# Altium footprint library Generic Footprint.PcbLib: 160 footprints (part 15 of 20)
Each footprint in its own frame and in the unit in brackets; x right, y up, seen from the top. Pads: shape width x height; smd on the part's side, far side on the other; paste and mask are expansions set on the pad; w line width, h text height; cw(c..) or ccw(c..) is an arc to the next point about the centre after c.
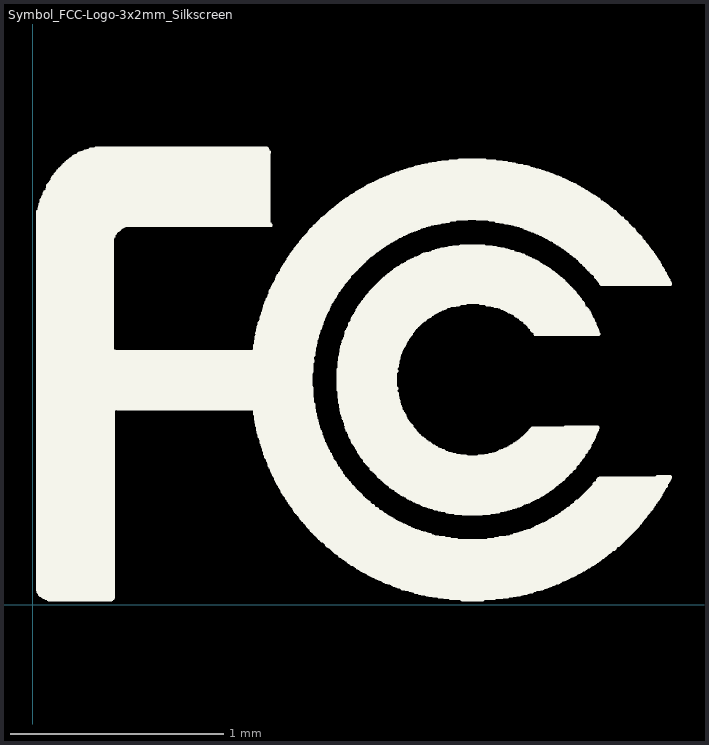
[diagram p14: the footprint, top view; thin cyan lines are the x and y axes]

## Symbol_FCC-Logo-3x2mm_Silkscreen [mm]
pads (8620):
  round 0.02 on Top Overlay: 1(0.025,0.07) 1(0.025,0.073) 1(0.025,0.076) 1(0.025,0.08) 1(0.025,0.083) 1(0.025,0.087) 1(0.025,0.09) 1(0.025,0.093) 1(0.025,0.097) 1(0.025,0.1) 1(0.025,0.104) 1(0.025,0.107) 1(0.025,0.11) 1(0.025,0.114) 1(0.025,0.117) 1(0.025,0.121) 1(0.025,0.124) 1(0.025,0.127) 1(0.025,0.131) 1(0.025,0.134) 1(0.025,0.138) 1(0.025,0.141) 1(0.025,0.144) 1(0.025,0.148) 1(0.025,0.151) 1(0.025,0.155) 1(0.025,0.158) 1(0.025,0.161) 1(0.025,0.165) 1(0.025,0.168) 1(0.025,0.172) 1(0.025,0.175) 1(0.025,0.178) 1(0.025,0.182) 1(0.025,0.185) 1(0.025,0.189) 1(0.025,0.192) 1(0.025,0.195) 1(0.025,0.199) 1(0.025,0.202) 1(0.025,0.206) 1(0.025,0.209) 1(0.025,0.212) 1(0.025,0.216) 1(0.025,0.219) 1(0.025,0.223) 1(0.025,0.226) 1(0.025,0.229) 1(0.025,0.233) 1(0.025,0.236) 1(0.025,0.24) 1(0.025,0.243) 1(0.025,0.246) 1(0.025,0.25) 1(0.025,0.253) 1(0.025,0.257) 1(0.025,0.26) 1(0.025,0.263) 1(0.025,0.267) 1(0.025,0.27) 1(0.025,0.274) 1(0.025,0.277) 1(0.025,0.28) 1(0.025,0.284) 1(0.025,0.287) 1(0.025,0.291) 1(0.025,0.294) 1(0.025,0.297) 1(0.025,0.301) 1(0.025,0.304) 1(0.025,0.308) 1(0.025,0.311) 1(0.025,0.314) 1(0.025,0.318) 1(0.025,0.321) 1(0.025,0.325) 1(0.025,0.328) 1(0.025,0.331) 1(0.025,0.335) 1(0.025,0.338) 1(0.025,0.342) 1(0.025,0.345) 1(0.025,0.348) 1(0.025,0.352) 1(0.025,0.355) 1(0.025,0.359) 1(0.025,0.362) 1(0.025,0.365) 1(0.025,0.369) 1(0.025,0.372) 1(0.025,0.376) 1(0.025,0.379) 1(0.025,0.382) 1(0.025,0.386) 1(0.025,0.389) 1(0.025,0.393) 1(0.025,0.396) 1(0.025,0.399) 1(0.025,0.403) 1(0.025,0.406) 1(0.025,0.41) 1(0.025,0.413) 1(0.025,0.416) 1(0.025,0.42) 1(0.025,0.423) 1(0.025,0.427) 1(0.025,0.43) 1(0.025,0.433) 1(0.025,0.437) 1(0.025,0.44) 1(0.025,0.444) 1(0.025,0.447) 1(0.025,0.45) 1(0.025,0.454) 1(0.025,0.457) 1(0.025,0.461) 1(0.025,0.464) 1(0.025,0.467) 1(0.025,0.471) 1(0.025,0.474) 1(0.025,0.478) 1(0.025,0.481) 1(0.025,0.484) 1(0.025,0.488) 1(0.025,0.491) 1(0.025,0.495) 1(0.025,0.498) 1(0.025,0.501) 1(0.025,0.505) 1(0.025,0.508) 1(0.025,0.512) 1(0.025,0.515) 1(0.025,0.518) 1(0.025,0.522) 1(0.025,0.525) 1(0.025,0.529) 1(0.025,0.532) 1(0.025,0.535) 1(0.025,0.539) 1(0.025,0.542) 1(0.025,0.546) 1(0.025,0.549) 1(0.025,0.552) 1(0.025,0.556) 1(0.025,0.559) 1(0.025,0.563) 1(0.025,0.566) 1(0.025,0.569) 1(0.025,0.573) 1(0.025,0.576) 1(0.025,0.58) 1(0.025,0.583) 1(0.025,0.586) 1(0.025,0.59) 1(0.025,0.593) 1(0.025,0.597) 1(0.025,0.6) 1(0.025,0.603) 1(0.025,0.607) 1(0.025,0.61) 1(0.025,0.614) 1(0.025,0.617) 1(0.025,0.62) 1(0.025,0.624) 1(0.025,0.627) 1(0.025,0.631) 1(0.025,0.634) 1(0.025,0.637) 1(0.025,0.641) 1(0.025,0.644) 1(0.025,0.648) 1(0.025,0.651) 1(0.025,0.654) 1(0.025,0.658) 1(0.025,0.661) 1(0.025,0.665) 1(0.025,0.668) 1(0.025,0.671) 1(0.025,0.675) 1(0.025,0.678) 1(0.025,0.682) 1(0.025,0.685) 1(0.025,0.688) 1(0.025,0.692) 1(0.025,0.695) 1(0.025,0.699) 1(0.025,0.702) 1(0.025,0.705) 1(0.025,0.709) 1(0.025,0.712) 1(0.025,0.716) 1(0.025,0.719) 1(0.025,0.722) 1(0.025,0.726) 1(0.025,0.729) 1(0.025,0.733) 1(0.025,0.736) 1(0.025,0.739) 1(0.025,0.743) 1(0.025,0.746) 1(0.025,0.75) 1(0.025,0.753) 1(0.025,0.756) 1(0.025,0.76) 1(0.025,0.763) 1(0.025,0.767) 1(0.025,0.77) 1(0.025,0.773) 1(0.025,0.777) 1(0.025,0.78) 1(0.025,0.784) 1(0.025,0.787) 1(0.025,0.79) 1(0.025,0.794) 1(0.025,0.797) 1(0.025,0.801) 1(0.025,0.804) 1(0.025,0.807) 1(0.025,0.811) 1(0.025,0.814) 1(0.025,0.818) 1(0.025,0.821) 1(0.025,0.824) 1(0.025,0.828) 1(0.025,0.831) 1(0.025,0.835) 1(0.025,0.838) 1(0.025,0.841) 1(0.025,0.845) 1(0.025,0.848) 1(0.025,0.852) 1(0.025,0.855) 1(0.025,0.858) 1(0.025,0.862) 1(0.025,0.865) 1(0.025,0.869) 1(0.025,0.872) 1(0.025,0.875) 1(0.025,0.879) 1(0.025,0.882) 1(0.025,0.886) 1(0.025,0.889) 1(0.025,0.892) 1(0.025,0.896) 1(0.025,0.899) 1(0.025,0.903) 1(0.025,0.906) 1(0.025,0.909) 1(0.025,0.913) 1(0.025,0.916) 1(0.025,0.92) 1(0.025,0.923) 1(0.025,0.926) 1(0.025,0.93) 1(0.025,0.933) 1(0.025,0.937) 1(0.025,0.94) 1(0.025,0.943) 1(0.025,0.947) 1(0.025,0.95) 1(0.025,0.954) 1(0.025,0.957) 1(0.025,0.96) 1(0.025,0.964) 1(0.025,0.967) 1(0.025,0.971) 1(0.025,0.974) 1(0.025,0.977) 1(0.025,0.981) 1(0.025,0.984) 1(0.025,0.988) 1(0.025,0.991) 1(0.025,0.994) 1(0.025,0.998) 1(0.025,1.001) 1(0.025,1.005) 1(0.025,1.008) 1(0.025,1.011) 1(0.025,1.015) 1(0.025,1.018) 1(0.025,1.022) 1(0.025,1.025) 1(0.025,1.028) 1(0.025,1.032) 1(0.025,1.035) 1(0.025,1.039) 1(0.025,1.042) 1(0.025,1.045) 1(0.025,1.049) 1(0.025,1.052) 1(0.025,1.056) 1(0.025,1.059) 1(0.025,1.062) 1(0.025,1.066) 1(0.025,1.069) 1(0.025,1.073) 1(0.025,1.076) 1(0.025,1.079) 1(0.025,1.083) 1(0.025,1.086) 1(0.025,1.09) 1(0.025,1.093) 1(0.025,1.096) 1(0.025,1.1) 1(0.025,1.103) 1(0.025,1.107) 1(0.025,1.11) 1(0.025,1.113) 1(0.025,1.117) 1(0.025,1.12) 1(0.025,1.124) 1(0.025,1.127) 1(0.025,1.13) 1(0.025,1.134) 1(0.025,1.137) 1(0.025,1.141) 1(0.025,1.144) 1(0.025,1.147) 1(0.025,1.151) 1(0.025,1.154) 1(0.025,1.158) 1(0.025,1.161) 1(0.025,1.164) 1(0.025,1.168) 1(0.025,1.171) 1(0.025,1.175) 1(0.025,1.178) 1(0.025,1.181) 1(0.025,1.185) 1(0.025,1.188) 1(0.025,1.192) 1(0.025,1.195) 1(0.025,1.198) 1(0.025,1.202) 1(0.025,1.205) 1(0.025,1.209) 1(0.025,1.212) 1(0.025,1.215) 1(0.025,1.219) 1(0.025,1.222) 1(0.025,1.226) 1(0.025,1.229) 1(0.025,1.232) 1(0.025,1.236) 1(0.025,1.239) 1(0.025,1.243) 1(0.025,1.246) 1(0.025,1.249) 1(0.025,1.253) 1(0.025,1.256) 1(0.025,1.26) 1(0.025,1.263) 1(0.025,1.266) 1(0.025,1.27) 1(0.025,1.273) 1(0.025,1.277) 1(0.025,1.28) 1(0.025,1.283) 1(0.025,1.287) 1(0.025,1.29) 1(0.025,1.294) 1(0.025,1.297) 1(0.025,1.3) 1(0.025,1.304) 1(0.025,1.307) 1(0.025,1.311) 1(0.025,1.314) 1(0.025,1.317) 1(0.025,1.321) 1(0.025,1.324) 1(0.025,1.328) 1(0.025,1.331) 1(0.025,1.334) 1(0.025,1.338) 1(0.025,1.341) 1(0.025,1.345) 1(0.025,1.348) 1(0.025,1.351) 1(0.025,1.355) 1(0.025,1.358) 1(0.025,1.362) 1(0.025,1.365) 1(0.025,1.368) 1(0.025,1.372) 1(0.025,1.375) 1(0.025,1.379) 1(0.025,1.382) 1(0.025,1.385) 1(0.025,1.389) 1(0.025,1.392) 1(0.025,1.396) 1(0.025,1.399) 1(0.025,1.402) 1(0.025,1.406) 1(0.025,1.409) 1(0.025,1.413) 1(0.025,1.416) 1(0.025,1.419) 1(0.025,1.423) 1(0.025,1.426) 1(0.025,1.43) 1(0.025,1.433) 1(0.025,1.436) 1(0.025,1.44) 1(0.025,1.443) 1(0.025,1.447) 1(0.025,1.45) 1(0.025,1.453) 1(0.025,1.457) 1(0.025,1.46) 1(0.025,1.464) 1(0.025,1.467) 1(0.025,1.47) 1(0.025,1.474) 1(0.025,1.477) 1(0.025,1.481) 1(0.025,1.484) 1(0.025,1.487) 1(0.025,1.491) 1(0.025,1.494) 1(0.025,1.498) 1(0.025,1.501) 1(0.025,1.504) 1(0.025,1.508) 1(0.025,1.511) 1(0.025,1.515) 1(0.025,1.518) 1(0.025,1.521) 1(0.025,1.525) 1(0.025,1.528) 1(0.025,1.532) 1(0.025,1.535) 1(0.025,1.538) 1(0.025,1.542) 1(0.025,1.545) 1(0.025,1.549) 1(0.025,1.552) 1(0.025,1.555) 1(0.025,1.559) 1(0.025,1.562) 1(0.025,1.566) 1(0.025,1.569) 1(0.025,1.572) 1(0.025,1.576) 1(0.025,1.579) 1(0.025,1.583) 1(0.025,1.586) 1(0.025,1.589) 1(0.025,1.593) 1(0.025,1.596) 1(0.025,1.6) 1(0.025,1.603) 1(0.025,1.606) 1(0.025,1.61) 1(0.025,1.613) 1(0.025,1.617) 1(0.025,1.62) 1(0.025,1.623) 1(0.025,1.627) 1(0.025,1.63) 1(0.025,1.634) 1(0.025,1.637) 1(0.025,1.64) 1(0.025,1.644) 1(0.025,1.647) 1(0.025,1.651) 1(0.025,1.654) 1(0.025,1.657) 1(0.025,1.661) 1(0.025,1.664) 1(0.025,1.668) 1(0.025,1.671) 1(0.025,1.674) 1(0.025,1.678) 1(0.025,1.681) 1(0.025,1.685) 1(0.025,1.688) 1(0.025,1.691) 1(0.025,1.695) 1(0.025,1.698) 1(0.025,1.702) 1(0.025,1.705) 1(0.025,1.708) 1(0.025,1.712) 1(0.025,1.715) 1(0.025,1.719) 1(0.025,1.722) 1(0.025,1.725) 1(0.025,1.729) 1(0.025,1.732) 1(0.025,1.736) 1(0.025,1.739) 1(0.025,1.742) 1(0.025,1.746) 1(0.025,1.749) 1(0.025,1.753) 1(0.025,1.756) 1(0.025,1.759) 1(0.025,1.763) 1(0.025,1.766) 1(0.025,1.77) 1(0.025,1.773) 1(0.025,1.776) 1(0.025,1.78) 1(0.025,1.783) 1(0.025,1.787) 1(0.025,1.79) 1(0.025,1.793) 1(0.025,1.797) 1(0.025,1.8) 1(0.025,1.804) 1(0.025,1.807) 1(0.025,1.81) 1(0.025,1.814) 1(0.025,1.817) 1(0.025,1.821) 1(0.025,1.824) 1(0.025,1.827) 1(0.025,1.831) 1(0.025,1.834) 1(0.025,1.838) 1(0.029,0.059) 1(0.032,0.063) 1(0.032,0.076) 1(0.032,0.08) 1(0.032,0.083) 1(0.032,0.087) 1(0.032,0.09) 1(0.032,0.093) 1(0.032,0.097) 1(0.032,0.1) 1(0.032,0.104) 1(0.032,0.107) 1(0.032,0.11) 1(0.032,0.114) 1(0.032,0.117) 1(0.032,0.121) 1(0.032,0.124) 1(0.032,0.127) 1(0.032,0.131) 1(0.032,0.134) 1(0.032,0.138) 1(0.032,0.141) 1(0.032,0.144) 1(0.032,0.148) 1(0.032,0.151) 1(0.032,0.155) 1(0.032,0.158) 1(0.032,0.161) 1(0.032,0.165) 1(0.032,0.168) 1(0.032,0.172) 1(0.032,0.175) 1(0.032,0.178) 1(0.032,0.182) 1(0.032,0.185) 1(0.032,0.189) 1(0.032,0.192) 1(0.032,0.195) 1(0.032,0.199) 1(0.032,0.202) 1(0.032,0.206) 1(0.032,0.209) 1(0.032,0.212) 1(0.032,0.216) 1(0.032,0.219) 1(0.032,0.223) 1(0.032,0.226) 1(0.032,0.229) 1(0.032,0.233) 1(0.032,0.236) 1(0.032,0.24) 1(0.032,0.243) 1(0.032,0.246) 1(0.032,0.25) 1(0.032,0.253) 1(0.032,0.257) 1(0.032,0.26) 1(0.032,0.263) 1(0.032,0.267) 1(0.032,0.27) 1(0.032,0.274) 1(0.032,0.277) 1(0.032,0.28) 1(0.032,0.284) 1(0.032,0.287) 1(0.032,0.291) 1(0.032,0.294) 1(0.032,0.297) 1(0.032,0.301) 1(0.032,0.304) 1(0.032,0.308) 1(0.032,0.311) 1(0.032,0.314) 1(0.032,0.318) 1(0.032,0.321) 1(0.032,0.325) 1(0.032,0.328) 1(0.032,0.331) 1(0.032,0.335) 1(0.032,0.338) 1(0.032,0.342) 1(0.032,0.345) 1(0.032,0.348) 1(0.032,0.352) 1(0.032,0.355) 1(0.032,0.359) 1(0.032,0.362) 1(0.032,0.365) 1(0.032,0.369) 1(0.032,0.372) 1(0.032,0.376) 1(0.032,0.379) 1(0.032,0.382) 1(0.032,0.386) 1(0.032,0.389) 1(0.032,0.393) 1(0.032,0.396) 1(0.032,0.399) 1(0.032,0.403) 1(0.032,0.406) 1(0.032,0.41) 1(0.032,0.413) 1(0.032,0.416) 1(0.032,0.42) 1(0.032,0.423) 1(0.032,0.427) 1(0.032,0.43) 1(0.032,0.433) 1(0.032,0.437) 1(0.032,0.44) 1(0.032,0.444) 1(0.032,0.447) 1(0.032,0.45) 1(0.032,0.454) 1(0.032,0.457) 1(0.032,0.461) 1(0.032,0.464) 1(0.032,0.467) 1(0.032,0.471) 1(0.032,0.474) 1(0.032,0.478) 1(0.032,0.481) 1(0.032,0.484) 1(0.032,0.488) 1(0.032,0.491) 1(0.032,0.495) 1(0.032,0.498) 1(0.032,0.501) 1(0.032,0.505) 1(0.032,0.508) 1(0.032,0.512) 1(0.032,0.515) 1(0.032,0.518) 1(0.032,0.522) 1(0.032,0.525) 1(0.032,0.529) 1(0.032,0.532) 1(0.032,0.535) 1(0.032,0.539) 1(0.032,0.542) 1(0.032,0.546) 1(0.032,0.549) 1(0.032,0.552) 1(0.032,0.556) 1(0.032,0.559) 1(0.032,0.563) 1(0.032,0.566) 1(0.032,0.569) 1(0.032,0.573) 1(0.032,0.576) 1(0.032,0.58) 1(0.032,0.583) 1(0.032,0.586) 1(0.032,0.59) 1(0.032,0.593) 1(0.032,0.597) 1(0.032,0.6) 1(0.032,0.603) 1(0.032,0.607) 1(0.032,0.61) 1(0.032,0.614) 1(0.032,0.617) 1(0.032,0.62) 1(0.032,0.624) 1(0.032,0.627) 1(0.032,0.631) 1(0.032,0.634) 1(0.032,0.637) 1(0.032,0.641) 1(0.032,0.644) 1(0.032,0.648) 1(0.032,0.651) 1(0.032,0.654) 1(0.032,0.658) 1(0.032,0.661) 1(0.032,0.665) 1(0.032,0.668) 1(0.032,0.671) 1(0.032,0.675) 1(0.032,0.678) 1(0.032,0.682) 1(0.032,0.685) 1(0.032,0.688) 1(0.032,0.692) 1(0.032,0.695) 1(0.032,0.699) 1(0.032,0.702) 1(0.032,0.705) 1(0.032,0.709) 1(0.032,0.712) 1(0.032,0.716) 1(0.032,0.719) 1(0.032,0.722) 1(0.032,0.726) 1(0.032,0.729) 1(0.032,0.733) 1(0.032,0.736) 1(0.032,0.739) 1(0.032,0.743) 1(0.032,0.746) 1(0.032,0.75) 1(0.032,0.753) 1(0.032,0.756) 1(0.032,0.76) 1(0.032,0.763) 1(0.032,0.767) 1(0.032,0.77) 1(0.032,0.773) 1(0.032,0.777) 1(0.032,0.78) 1(0.032,0.784) 1(0.032,0.787) 1(0.032,0.79) 1(0.032,0.794) 1(0.032,0.797) 1(0.032,0.801) 1(0.032,0.804) 1(0.032,0.807) 1(0.032,0.811) 1(0.032,0.814) 1(0.032,0.818) 1(0.032,0.821) 1(0.032,0.824) 1(0.032,0.828) 1(0.032,0.831) 1(0.032,0.835) 1(0.032,0.838) 1(0.032,0.841) 1(0.032,0.845) 1(0.032,0.848) 1(0.032,0.852) 1(0.032,0.855) 1(0.032,0.858) 1(0.032,0.862) 1(0.032,0.865) 1(0.032,0.869) 1(0.032,0.872) 1(0.032,0.875) 1(0.032,0.879) 1(0.032,0.882) 1(0.032,0.886) 1(0.032,0.889) 1(0.032,0.892) 1(0.032,0.896) 1(0.032,0.899) 1(0.032,0.903) 1(0.032,0.906) 1(0.032,0.909) 1(0.032,0.913) 1(0.032,0.916) 1(0.032,0.92) 1(0.032,0.923) 1(0.032,0.926) 1(0.032,0.93) 1(0.032,0.933) 1(0.032,0.937) 1(0.032,0.94) 1(0.032,0.943) 1(0.032,0.947) 1(0.032,0.95) 1(0.032,0.954) 1(0.032,0.957) 1(0.032,0.96) 1(0.032,0.964) 1(0.032,0.967) 1(0.032,0.971) 1(0.032,0.974) 1(0.032,0.977) 1(0.032,0.981) 1(0.032,0.984) 1(0.032,0.988) 1(0.032,0.991) 1(0.032,0.994) 1(0.032,0.998) 1(0.032,1.001) 1(0.032,1.005) 1(0.032,1.008) 1(0.032,1.011) 1(0.032,1.015) 1(0.032,1.018) 1(0.032,1.022) 1(0.032,1.025) 1(0.032,1.028) 1(0.032,1.032) 1(0.032,1.035) 1(0.032,1.039) 1(0.032,1.042) 1(0.032,1.045) 1(0.032,1.049) 1(0.032,1.052) 1(0.032,1.056) 1(0.032,1.059) 1(0.032,1.062) 1(0.032,1.066) 1(0.032,1.069) 1(0.032,1.073) 1(0.032,1.076) 1(0.032,1.079) 1(0.032,1.083) 1(0.032,1.086) 1(0.032,1.09) 1(0.032,1.093) 1(0.032,1.096) 1(0.032,1.1) 1(0.032,1.103) 1(0.032,1.107) 1(0.032,1.11) 1(0.032,1.113) 1(0.032,1.117) 1(0.032,1.12) 1(0.032,1.124) 1(0.032,1.127) 1(0.032,1.13) 1(0.032,1.134) 1(0.032,1.137) 1(0.032,1.141) 1(0.032,1.144) 1(0.032,1.147) 1(0.032,1.151) 1(0.032,1.154) 1(0.032,1.158) 1(0.032,1.161) 1(0.032,1.164) 1(0.032,1.168) 1(0.032,1.171) 1(0.032,1.175) 1(0.032,1.178) 1(0.032,1.181) 1(0.032,1.185) 1(0.032,1.188) 1(0.032,1.192) 1(0.032,1.195) 1(0.032,1.198) 1(0.032,1.202) 1(0.032,1.205) 1(0.032,1.209) 1(0.032,1.212) 1(0.032,1.215) 1(0.032,1.219) 1(0.032,1.222) 1(0.032,1.226) 1(0.032,1.229) 1(0.032,1.232) 1(0.032,1.236) 1(0.032,1.239) 1(0.032,1.243) 1(0.032,1.246) 1(0.032,1.249) 1(0.032,1.253) 1(0.032,1.256) 1(0.032,1.26) 1(0.032,1.263) 1(0.032,1.266) 1(0.032,1.27) 1(0.032,1.273) 1(0.032,1.277) 1(0.032,1.28) 1(0.032,1.283) 1(0.032,1.287) 1(0.032,1.29) 1(0.032,1.294) 1(0.032,1.297) 1(0.032,1.3) 1(0.032,1.304) 1(0.032,1.307) 1(0.032,1.311) 1(0.032,1.314) 1(0.032,1.317) 1(0.032,1.321) 1(0.032,1.324) 1(0.032,1.328) 1(0.032,1.331) 1(0.032,1.334) 1(0.032,1.338) 1(0.032,1.341) 1(0.032,1.345) 1(0.032,1.348) 1(0.032,1.351) 1(0.032,1.355) 1(0.032,1.358) 1(0.032,1.362) 1(0.032,1.365) 1(0.032,1.368) 1(0.032,1.372) 1(0.032,1.375) 1(0.032,1.379) 1(0.032,1.382) 1(0.032,1.385) 1(0.032,1.389) 1(0.032,1.392) 1(0.032,1.396) 1(0.032,1.399) 1(0.032,1.402) 1(0.032,1.406) 1(0.032,1.409) 1(0.032,1.413) 1(0.032,1.416) 1(0.032,1.419) 1(0.032,1.423) 1(0.032,1.426) 1(0.032,1.43) 1(0.032,1.433) 1(0.032,1.436) 1(0.032,1.44) 1(0.032,1.443) 1(0.032,1.447) 1(0.032,1.45) 1(0.032,1.453) 1(0.032,1.457) 1(0.032,1.46) 1(0.032,1.464) 1(0.032,1.467) 1(0.032,1.47) 1(0.032,1.474) 1(0.032,1.477) 1(0.032,1.481) 1(0.032,1.484) 1(0.032,1.487) 1(0.032,1.491) 1(0.032,1.494) 1(0.032,1.498) 1(0.032,1.501) 1(0.032,1.504) 1(0.032,1.508) 1(0.032,1.511) 1(0.032,1.515) 1(0.032,1.518) 1(0.032,1.521) 1(0.032,1.525) 1(0.032,1.528) 1(0.032,1.532) 1(0.032,1.535) 1(0.032,1.538) 1(0.032,1.542) 1(0.032,1.545) 1(0.032,1.549) 1(0.032,1.552) 1(0.032,1.555) 1(0.032,1.559) 1(0.032,1.562) 1(0.032,1.566) 1(0.032,1.569) 1(0.032,1.572) 1(0.032,1.576) 1(0.032,1.579) 1(0.032,1.583) 1(0.032,1.586) 1(0.032,1.589) 1(0.032,1.593) 1(0.032,1.596) 1(0.032,1.6) 1(0.032,1.603) 1(0.032,1.606) 1(0.032,1.61) 1(0.032,1.613) 1(0.032,1.617) 1(0.032,1.62) 1(0.032,1.623) 1(0.032,1.627) 1(0.032,1.63) 1(0.032,1.634) 1(0.032,1.637) 1(0.032,1.64) 1(0.032,1.644) 1(0.032,1.647) 1(0.032,1.651) 1(0.032,1.654) 1(0.032,1.657) 1(0.032,1.661) 1(0.032,1.664) 1(0.032,1.668) 1(0.032,1.671) 1(0.032,1.674) 1(0.032,1.678) 1(0.032,1.681) 1(0.032,1.685) 1(0.032,1.688) 1(0.032,1.691) 1(0.032,1.695) 1(0.032,1.698) 1(0.032,1.702) 1(0.032,1.705) 1(0.032,1.708) 1(0.032,1.712) 1(0.032,1.715) 1(0.032,1.719) 1(0.032,1.722) 1(0.032,1.725) 1(0.032,1.729) 1(0.032,1.732) 1(0.032,1.736) 1(0.032,1.739) 1(0.032,1.742) 1(0.032,1.746) 1(0.032,1.749) 1(0.032,1.753) 1(0.032,1.756) 1(0.032,1.759) 1(0.032,1.763) 1(0.032,1.766) 1(0.032,1.77) 1(0.032,1.773) 1(0.032,1.776) 1(0.032,1.78) 1(0.032,1.783) 1(0.032,1.787) 1(0.032,1.79) 1(0.032,1.793) 1(0.032,1.797) 1(0.032,1.8) 1(0.032,1.804) 1(0.032,1.807) 1(0.032,1.81) 1(0.032,1.814) 1(0.032,1.817) 1(0.032,1.821) 1(0.032,1.824) 1(0.032,1.827) 1(0.032,1.831) 1(0.032,1.838) 1(0.032,1.841) 1(0.032,1.844) 1(0.032,1.848) 1(0.032,1.851) 1(0.036,0.049) 1(0.036,0.053) 1(0.036,0.059) 1(0.036,0.066) 1(0.036,0.076) 1(0.036,0.08) 1(0.036,0.083) 1(0.036,0.087) 1(0.036,0.09) 1(0.036,0.093) 1(0.036,0.097) 1(0.036,0.1) 1(0.036,0.104) 1(0.036,0.107) 1(0.036,0.11) 1(0.036,0.114) 1(0.036,0.117) 1(0.036,0.121) 1(0.036,0.124) 1(0.036,0.127) 1(0.036,0.131) 1(0.036,0.134) 1(0.036,0.138) 1(0.036,0.141) 1(0.036,0.144) 1(0.036,0.148) 1(0.036,0.151) 1(0.036,0.155) 1(0.036,0.158) 1(0.036,0.161) 1(0.036,0.165) 1(0.036,0.168) 1(0.036,0.172) 1(0.036,0.175) 1(0.036,0.178) 1(0.036,0.182) 1(0.036,0.185) 1(0.036,0.189) 1(0.036,0.192) 1(0.036,0.195) 1(0.036,0.199) 1(0.036,0.202) 1(0.036,0.206) 1(0.036,0.209) 1(0.036,0.212) 1(0.036,0.216) 1(0.036,0.219) 1(0.036,0.223) 1(0.036,0.226) 1(0.036,0.229) 1(0.036,0.233) 1(0.036,0.236) 1(0.036,0.24) 1(0.036,0.243) 1(0.036,0.246) 1(0.036,0.25) 1(0.036,0.253) 1(0.036,0.257) 1(0.036,0.26) 1(0.036,0.263) 1(0.036,0.267) 1(0.036,0.27) 1(0.036,0.274) 1(0.036,0.277) 1(0.036,0.28) 1(0.036,0.284) 1(0.036,0.287) 1(0.036,0.291) 1(0.036,0.294) 1(0.036,0.297) 1(0.036,0.301) 1(0.036,0.304) 1(0.036,0.308) 1(0.036,0.311) 1(0.036,0.314) 1(0.036,0.318) 1(0.036,0.321) 1(0.036,0.325) 1(0.036,0.328) 1(0.036,0.331) 1(0.036,0.335) 1(0.036,0.338) 1(0.036,0.342) 1(0.036,0.345) 1(0.036,0.348) 1(0.036,0.352) 1(0.036,0.355) 1(0.036,0.359) 1(0.036,0.362) 1(0.036,0.365) 1(0.036,0.369) 1(0.036,0.372) 1(0.036,0.376) 1(0.036,0.379) 1(0.036,0.382) 1(0.036,0.386) 1(0.036,0.389) 1(0.036,0.393) 1(0.036,0.396) 1(0.036,0.399) 1(0.036,0.403) 1(0.036,0.406) 1(0.036,0.41) 1(0.036,0.413) 1(0.036,0.416) 1(0.036,0.42) 1(0.036,0.423) 1(0.036,0.427) 1(0.036,0.43) 1(0.036,0.433) 1(0.036,0.437) 1(0.036,0.44) 1(0.036,0.444) 1(0.036,0.447) 1(0.036,0.45) 1(0.036,0.454) 1(0.036,0.457) 1(0.036,0.461) 1(0.036,0.464) 1(0.036,0.467) 1(0.036,0.471) 1(0.036,0.474) 1(0.036,0.478) 1(0.036,0.481) 1(0.036,0.484) 1(0.036,0.488) 1(0.036,0.491) 1(0.036,0.495) 1(0.036,0.498) 1(0.036,0.501) 1(0.036,0.505) 1(0.036,0.508) 1(0.036,0.512) 1(0.036,0.515) 1(0.036,0.518) 1(0.036,0.522) 1(0.036,0.525) 1(0.036,0.529) 1(0.036,0.532) 1(0.036,0.535) 1(0.036,0.539) 1(0.036,0.542) 1(0.036,0.546) 1(0.036,0.549) 1(0.036,0.552) 1(0.036,0.556) 1(0.036,0.559) 1(0.036,0.563) 1(0.036,0.566) 1(0.036,0.569) 1(0.036,0.573) 1(0.036,0.576) 1(0.036,0.58) 1(0.036,0.583) 1(0.036,0.586) 1(0.036,0.59) 1(0.036,0.593) 1(0.036,0.597) 1(0.036,0.6) 1(0.036,0.603) 1(0.036,0.607) 1(0.036,0.61) 1(0.036,0.614) 1(0.036,0.617) 1(0.036,0.62) 1(0.036,0.624) 1(0.036,0.627) 1(0.036,0.631) 1(0.036,0.634) 1(0.036,0.637) 1(0.036,0.641) 1(0.036,0.644) 1(0.036,0.648) 1(0.036,0.651) 1(0.036,0.654) 1(0.036,0.658) 1(0.036,0.661) 1(0.036,0.665) 1(0.036,0.668) 1(0.036,0.671) 1(0.036,0.675) 1(0.036,0.678) 1(0.036,0.682) 1(0.036,0.685) 1(0.036,0.688) 1(0.036,0.692) 1(0.036,0.695) 1(0.036,0.699) 1(0.036,0.702) 1(0.036,0.705) 1(0.036,0.709) 1(0.036,0.712) 1(0.036,0.716) 1(0.036,0.719) 1(0.036,0.722) 1(0.036,0.726) 1(0.036,0.729) 1(0.036,0.733) 1(0.036,0.736) 1(0.036,0.739) 1(0.036,0.743) 1(0.036,0.746) 1(0.036,0.75) 1(0.036,0.753) 1(0.036,0.756) 1(0.036,0.76) 1(0.036,0.763) 1(0.036,0.767) 1(0.036,0.77) 1(0.036,0.773) 1(0.036,0.777) 1(0.036,0.78) 1(0.036,0.784) 1(0.036,0.787) 1(0.036,0.79) 1(0.036,0.794) 1(0.036,0.797) 1(0.036,0.801) 1(0.036,0.804) 1(0.036,0.807) 1(0.036,0.811) 1(0.036,0.814) 1(0.036,0.818) 1(0.036,0.821) 1(0.036,0.824) 1(0.036,0.828) 1(0.036,0.831) 1(0.036,0.835) 1(0.036,0.838) 1(0.036,0.841) 1(0.036,0.845) 1(0.036,0.848) 1(0.036,0.852) 1(0.036,0.855) 1(0.036,0.858) 1(0.036,0.862) 1(0.036,0.865) 1(0.036,0.869) 1(0.036,0.872) 1(0.036,0.875) 1(0.036,0.879) 1(0.036,0.882) 1(0.036,0.886) 1(0.036,0.889) 1(0.036,0.892) 1(0.036,0.896) 1(0.036,0.899) 1(0.036,0.903) 1(0.036,0.906) 1(0.036,0.909) 1(0.036,0.913) 1(0.036,0.916) 1(0.036,0.92) 1(0.036,0.923) 1(0.036,0.926) 1(0.036,0.93) 1(0.036,0.933) 1(0.036,0.937) 1(0.036,0.94) 1(0.036,0.943) 1(0.036,0.947) 1(0.036,0.95) 1(0.036,0.954) 1(0.036,0.957) 1(0.036,0.96) 1(0.036,0.964) 1(0.036,0.967) 1(0.036,0.971) 1(0.036,0.974) 1(0.036,0.977) 1(0.036,0.981) 1(0.036,0.984) 1(0.036,0.988) 1(0.036,0.991) 1(0.036,0.994) 1(0.036,0.998) 1(0.036,1.001) 1(0.036,1.005) 1(0.036,1.008) 1(0.036,1.011) 1(0.036,1.015) 1(0.036,1.018) 1(0.036,1.022) 1(0.036,1.025) 1(0.036,1.028) 1(0.036,1.032) 1(0.036,1.035) 1(0.036,1.039) 1(0.036,1.042) 1(0.036,1.045) 1(0.036,1.049) 1(0.036,1.052) 1(0.036,1.056) 1(0.036,1.059) 1(0.036,1.062) 1(0.036,1.066) 1(0.036,1.069) 